# Altium footprint library IC.PcbLib: 220 footprints (part 14 of 14)
Each footprint in its own frame and in the unit in brackets; x right, y up, seen from the top. Pads: shape width x height; smd on the part's side, far side on the other; paste and mask are expansions set on the pad; w line width, h text height; cw(c..) or ccw(c..) is an arc to the next point about the centre after c.
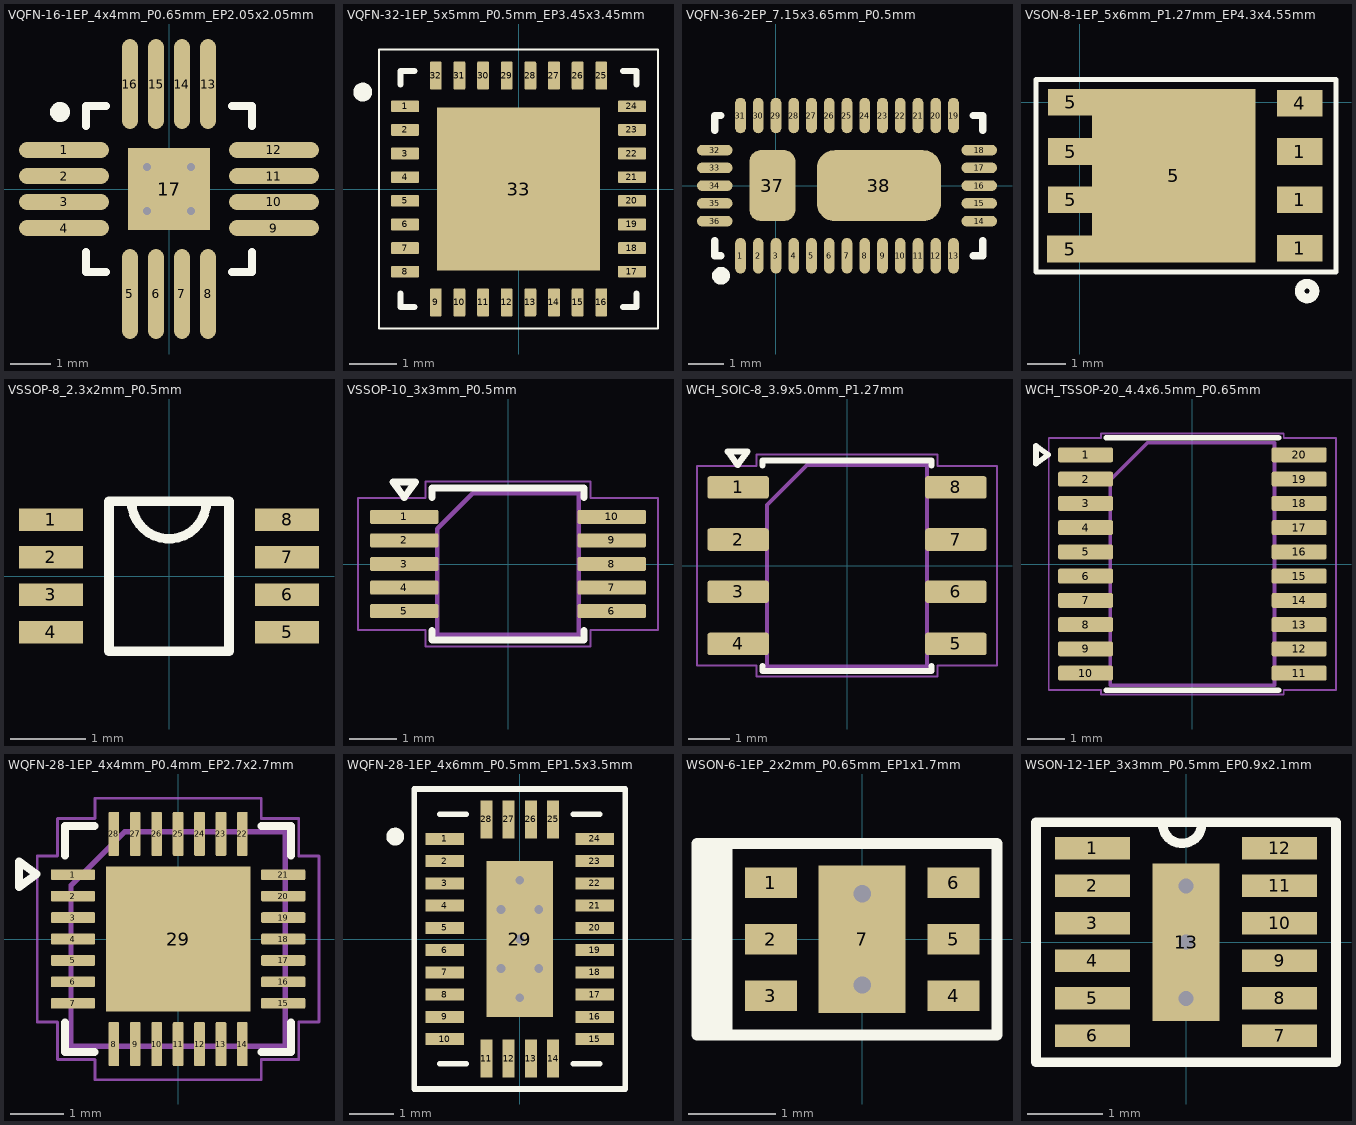
[diagram p13: the footprints below, top view; thin cyan lines are the x and y axes]

## VQFN-16-1EP_4x4mm_P0.65mm_EP2.05x2.05mm [mm] "VQFN-16 with exposed pad 2.05x2.05mm, body 4x4mm, pitch 0.65mm"
height 1
pads (17):
  oval 2.25x0.4 smd mask+0.076: 1(-2.625,0.975) 2(-2.625,0.325) 3(-2.625,-0.325) 4(-2.625,-0.975) 9(2.625,-0.975) 10(2.625,-0.325) 11(2.625,0.325) 12(2.625,0.975)
  oval 0.4x2.25 smd mask+0.076: 5(-0.975,-2.625) 6(-0.325,-2.625) 7(0.325,-2.625) 8(0.975,-2.625) 13(0.975,2.625) 14(0.325,2.625) 15(-0.325,2.625) 16(-0.975,2.625)
  rect 2.05x2.05 smd mask+0.076: 17(0,0)
via 0.55,-0.55 diameter 0.5 hole 0.2
via -0.55,-0.55 diameter 0.5 hole 0.2
via 0.55,0.55 diameter 0.5 hole 0.2
via -0.55,0.55 diameter 0.5 hole 0.2
Top Overlay:
  circle w0.25: c-2.725,1.925 r0.125
  lines w0.2: -2.075,-1.575 -2.075,-2.075 -1.575,-2.075 ; -2.075,1.575 -2.075,2.075 -1.575,2.075 ; 1.575,-2.075 2.075,-2.075 2.075,-1.575 ; 1.575,2.075 2.075,2.075 2.075,1.575
3D body "INA3221.step": height 1, standoff 0, extent -2.075,-2.075 2.075,2.075

## VQFN-32-1EP_5x5mm_P0.5mm_EP3.45x3.45mm [mm] "VQFN-32 with exposed pad 3.45x3.45mm, body 5x5mm, pitch 0.5mm"
pads (33):
  rrect25% 0.6x0.25 smd mask+0: 1(-2.4,1.75) 2(-2.4,1.25) 3(-2.4,0.75) 4(-2.4,0.25) 5(-2.4,-0.25) 6(-2.4,-0.75) 7(-2.4,-1.25) 8(-2.4,-1.75) 17(2.4,-1.75) 18(2.4,-1.25) 19(2.4,-0.75) 20(2.4,-0.25) 21(2.4,0.25) 22(2.4,0.75) 23(2.4,1.25) 24(2.4,1.75)
  rrect25% 0.25x0.6 smd mask+0: 9(-1.75,-2.4) 10(-1.25,-2.4) 11(-0.75,-2.4) 12(-0.25,-2.4) 13(0.25,-2.4) 14(0.75,-2.4) 15(1.25,-2.4) 16(1.75,-2.4) 25(1.75,2.4) 26(1.25,2.4) 27(0.75,2.4) 28(0.25,2.4) 29(-0.25,2.4) 30(-0.75,2.4) 31(-1.25,2.4) 32(-1.75,2.4)
  rect 3.45x3.45 smd paste-3 mask+0: 33(0,0)
Top Overlay:
  circle w0.2: c-3.295,2.05 r0.1
  lines w0.05: -2.95,-2.95 2.95,-2.95 2.95,2.95 -2.95,2.95 -2.95,-2.95
  lines w0.127: -2.5,-2.205 -2.5,-2.5 -2.205,-2.5 ; -2.5,2.205 -2.5,2.5 -2.205,2.5 ; 2.205,-2.5 2.5,-2.5 2.5,-2.205 ; 2.205,2.5 2.5,2.5 2.5,2.205
Top Paste:
  region: 1.59,-1.59 0.1,-1.59 0.1,-0.1 1.59,-0.1
  region: -0.1,-1.59 -1.59,-1.59 -1.59,-0.1 -0.1,-0.1
  region: 1.59,0.1 0.1,0.1 0.1,1.59 1.59,1.59
  region: -0.1,0.1 -1.59,0.1 -1.59,1.59 -0.1,1.59
Top Solder:
  drawing of 33 lines, arcs and shapes, not listed
3D body "User Library-VQFN-32.step": height 1.01, standoff 0, extent -2.56,-2.56 2.56,2.56

## VQFN-36-2EP_7.15x3.65mm_P0.5mm [mm] "VQFN-36 rectangular with dual exposed pads, body 7.15x3.65mm, pitch 0.5mm"
height 1
pads (38):
  oval 0.3x1 smd mask+0.076: 1(-1,-1.975) 2(-0.5,-1.975) 3(0,-1.975) 4(0.5,-1.975) 5(1,-1.975) 6(1.5,-1.975) 7(2,-1.975) 8(2.5,-1.975) 9(3,-1.975) 10(3.5,-1.975) 11(4,-1.975) 12(4.5,-1.975) 13(5,-1.975) 19(5,1.975) 20(4.5,1.975) 21(4,1.975) 22(3.5,1.975) 23(3,1.975) 24(2.5,1.975) 25(2,1.975) 26(1.5,1.975) 27(1,1.975) 28(0.5,1.975) 29(0,1.975) 30(-0.5,1.975) 31(-1,1.975)
  oval 1x0.3 smd mask+0.076: 14(5.725,-1) 15(5.725,-0.5) 16(5.725,0) 17(5.725,0.5) 18(5.725,1) 32(-1.725,1) 33(-1.725,0.5) 34(-1.725,0) 35(-1.725,-0.5) 36(-1.725,-1)
  rrect50% 1.3x2 smd: 37(-0.1,0)
  rrect50% 3.5x2 smd: 38(2.9,0)
Top Overlay:
  circle w0.25: c-1.55,-2.54 r0.125
  lines w0.2: -1.725,-1.55 -1.725,-1.975 -1.55,-1.975 ; -1.725,1.55 -1.725,1.975 -1.55,1.975 ; 5.55,-1.975 5.825,-1.975 5.825,-1.55 ; 5.55,1.975 5.825,1.975 5.825,1.55
3D body "VQFN36.step": height 1, standoff 0, extent -1.625,-1.875 5.625,1.875

## VSON-8-1EP_5x6mm_P1.27mm_EP4.3x4.55mm [mm] "VSONP-8 with exposed pad 4.29x4.55mm, pitch 1.27mm"
height 1.1
pads (9):
  rect 1.2x0.7 smd: 1(5.776,-3.83) 1(5.776,-2.56) 1(5.776,-1.29) 4(5.776,-0.02) 5(-0.249,-3.85) 5(-0.226,-2.56) 5(-0.226,-1.29) 5(-0.226,0)
  rect 4.295x4.55 smd: 5(2.475,-1.925)
Top Overlay:
  circle w0.254: c5.971,-4.953 r0.195
  lines w0.127: -1.143,-4.45 6.731,-4.45 6.731,0.6 -1.143,0.6 -1.143,-4.45
3D body "User Library-VSON-8.step": height 1.01, standoff 0.01, extent -0.226,-4.425 5.776,0.575

## VSSOP-8_2.3x2mm_P0.5mm [mm] "VSSOP-8 (US8), body 2.3x2.0mm, pitch 0.5mm"
height 0.9
pads (8):
  rect 0.85x0.3 smd mask+0.076: 1(-1.575,0.75) 2(-1.575,0.25) 3(-1.575,-0.25) 4(-1.575,-0.75) 5(1.575,-0.75) 6(1.575,-0.25) 7(1.575,0.25) 8(1.575,0.75)
Top Overlay:
  lines w0.127: -0.5,1 ccw(c0,1) 0.5,1 ; -0.8,-1 -0.8,1 0.8,1 0.8,-1 -0.8,-1
3D body "74AUP2G86DC,125.stp": height 1, standoff 0, extent -1.55,-1 1.55,1

## VSSOP-10_3x3mm_P0.5mm [mm] "VSSOP-10, 3 x 3 mm, 0.5 mm pitch — Vỏ IC mười chân [Vo IC muoi chan]"
height 0.95
pads (10):
  rrect25% 1.45x0.3 smd: 1(-2.2,1) 2(-2.2,0.5) 3(-2.2,0) 4(-2.2,-0.5) 5(-2.2,-1) 6(2.2,-1) 7(2.2,-0.5) 8(2.2,0) 9(2.2,0.5) 10(2.2,1)
Top Overlay:
  lines w0.15: -1.61,-1.41 -1.61,-1.61 1.61,-1.61 1.61,-1.41 ; -1.61,1.41 -1.61,1.61 1.61,1.61 1.61,1.41 ; -2.44,1.74 -2.2,1.41 -1.96,1.74 -2.44,1.74
Mechanical 2:
  lines w0.1: -1.5,-1.5 1.5,-1.5 1.5,1.5 -0.75,1.5 -1.5,0.75 -1.5,-1.5
Mechanical 4:
  lines w0.05: -3.18,-1.4 -3.18,1.4 -1.75,1.4 -1.75,1.75 1.75,1.75 1.75,1.4 3.18,1.4 3.18,-1.4 1.75,-1.4 1.75,-1.75 -1.75,-1.75 -1.75,-1.4 -3.18,-1.4
3D body "VSSOP-10_3x3mm_P0.5mm.step": height 0, standoff 0, extent -2.925,-1.15 2.925,1.15

## WCH_SOIC-8_3.9x5.0mm_P1.27mm [mm] "CH32V003J4M6, RISC-V MCU, 48 MHz, 16 KB flash — Vi điều khiển RISC-V 48 MHz, flash 16 KB [Vi dieu khien RISC-V 48 MHz, flash 16 KB]"
height 1.55
pads (8):
  rrect25% 1.5x0.55 smd: 1(-2.65,1.905) 2(-2.65,0.635) 3(-2.65,-0.635) 4(-2.65,-1.905) 5(2.65,-1.905) 6(2.65,-0.635) 7(2.65,0.635) 8(2.65,1.905)
Top Overlay:
  lines w0.15: -2.06,-2.44 -2.06,-2.56 2.06,-2.56 2.06,-2.44 ; -2.06,2.44 -2.06,2.56 2.06,2.56 2.06,2.44 ; -2.9,2.78 -2.66,2.45 -2.42,2.78 -2.9,2.78
Mechanical 2:
  lines w0.1: -1.95,-2.45 1.95,-2.45 1.95,2.45 -0.975,2.45 -1.95,1.475 -1.95,-2.45
Mechanical 4:
  lines w0.05: -3.65,-2.43 -3.65,2.43 -2.2,2.43 -2.2,2.7 2.2,2.7 2.2,2.43 3.65,2.43 3.65,-2.43 2.2,-2.43 2.2,-2.7 -2.2,-2.7 -2.2,-2.43 -3.65,-2.43
3D body "WCH_SOIC-8_3.9x5.0mm_P1.27mm.step": height 0, standoff 0, extent -3.4,-2.18 3.4,2.18

## WCH_TSSOP-20_4.4x6.5mm_P0.65mm [mm] "CH32V003F4P6, RISC-V MCU, 48 MHz, 16 KB flash — Vi điều khiển RISC-V 48 MHz, flash 16 KB [Vi dieu khien RISC-V 48 MHz, flash 16 KB]"
height 1.1
pads (20):
  rrect25% 1.475x0.4 smd: 1(-2.863,2.925) 2(-2.863,2.275) 3(-2.863,1.625) 4(-2.863,0.975) 5(-2.863,0.325) 6(-2.863,-0.325) 7(-2.863,-0.975) 8(-2.863,-1.625) 9(-2.863,-2.275) 10(-2.863,-2.925) 11(2.863,-2.925) 12(2.863,-2.275) 13(2.863,-1.625) 14(2.863,-0.975) 15(2.863,-0.325) 16(2.863,0.325) 17(2.863,0.975) 18(2.863,1.625) 19(2.863,2.275) 20(2.863,2.925)
Top Overlay:
  lines w0.15: -2.31,-3.385 2.31,-3.385 ; -2.31,3.385 2.31,3.385 ; -4.19,2.69 -3.86,2.93 -4.19,3.17 -4.19,2.69
Mechanical 2:
  lines w0.1: -2.2,-3.25 2.2,-3.25 2.2,3.25 -1.2,3.25 -2.2,2.25 -2.2,-3.25
Mechanical 4:
  lines w0.05: -3.85,-3.38 -3.85,3.38 -2.45,3.38 -2.45,3.5 2.45,3.5 2.45,3.38 3.85,3.38 3.85,-3.38 2.45,-3.38 2.45,-3.5 -2.45,-3.5 -2.45,-3.38 -3.85,-3.38
3D body "WCH_TSSOP-20_4.4x6.5mm_P0.65mm.step": height 0, standoff 0, extent -3.6,-3.125 3.6,3.125

## WQFN-28-1EP_4x4mm_P0.4mm_EP2.7x2.7mm [mm] "CH32X035G8U6, RISC-V MCU with USB PD PHY — Vi điều khiển RISC-V tích hợp PHY USB PD [Vi dieu khien RISC-V tich hop PHY USB PD]"
height 0.75
pads (29):
  rrect25% 0.825x0.2 smd: 1(-1.963,1.2) 2(-1.963,0.8) 3(-1.963,0.4) 4(-1.963,0) 5(-1.963,-0.4) 6(-1.963,-0.8) 7(-1.963,-1.2) 15(1.963,-1.2) 16(1.963,-0.8) 17(1.963,-0.4) 18(1.963,0) 19(1.963,0.4) 20(1.963,0.8) 21(1.963,1.2)
  rrect25% 0.2x0.825 smd: 8(-1.2,-1.963) 9(-0.8,-1.963) 10(-0.4,-1.963) 11(0,-1.963) 12(0.4,-1.963) 13(0.8,-1.963) 14(1.2,-1.963) 22(1.2,1.963) 23(0.8,1.963) 24(0.4,1.963) 25(0,1.963) 26(-0.4,1.963) 27(-0.8,1.963) 28(-1.2,1.963)
  rect 2.7x2.7 smd paste-2.7: 29(0,0)
Top Overlay:
  lines w0.15: -2.11,-1.56 -2.11,-2.11 -1.56,-2.11 ; -2.11,1.56 -2.11,2.11 -1.56,2.11 ; 1.56,-2.11 2.11,-2.11 2.11,-1.56 ; 1.56,2.11 2.11,2.11 2.11,1.56 ; -2.97,0.97 -2.64,1.21 -2.97,1.45 -2.97,0.97
Top Paste:
  region: -1.22,0.13 -0.13,0.13 -0.13,1.22 -1.22,1.22
  region: -1.22,-1.22 -0.13,-1.22 -0.13,-0.13 -1.22,-0.13
  region: 0.13,0.13 1.22,0.13 1.22,1.22 0.13,1.22
  region: 0.13,-1.22 1.22,-1.22 1.22,-0.13 0.13,-0.13
Mechanical 2:
  lines w0.1: -2,-2 2,-2 2,2 -1,2 -2,1 -2,-2
Mechanical 4:
  lines w0.05: -2.63,-1.55 -2.63,1.55 -2.25,1.55 -2.25,2.25 -1.55,2.25 -1.55,2.63 1.55,2.63 1.55,2.25 2.25,2.25 2.25,1.55 2.63,1.55 2.63,-1.55 2.25,-1.55 2.25,-2.25 1.55,-2.25 1.55,-2.63 -1.55,-2.63 -1.55,-2.25 -2.25,-2.25 -2.25,-1.55 -2.63,-1.55
3D body "WQFN-28-1EP_4x4mm_P0.4mm_EP2.7x2.7mm.step": height 0, standoff 0, extent -2.375,-2.375 2.375,2.375

## WQFN-28-1EP_4x6mm_P0.5mm_EP1.5x3.5mm [mm] "WQFN-28 with exposed pad 1.5x3.5mm, body 4x6mm, pitch 0.5mm"
height 0.8
pads (29):
  rect 0.86x0.27 smd: 1(-1.685,2.25) 2(-1.685,1.75) 3(-1.685,1.25) 4(-1.685,0.75) 5(-1.685,0.25) 6(-1.685,-0.25) 7(-1.685,-0.75) 8(-1.685,-1.25) 9(-1.685,-1.75) 10(-1.685,-2.25) 15(1.685,-2.25) 16(1.685,-1.75) 17(1.685,-1.25) 18(1.685,-0.75) 19(1.685,-0.25) 20(1.685,0.25) 21(1.685,0.75) 22(1.685,1.25) 23(1.685,1.75) 24(1.685,2.25)
  rect 0.27x0.86 smd: 11(-0.75,-2.685) 12(-0.25,-2.685) 13(0.25,-2.685) 14(0.75,-2.685) 25(0.75,2.685) 26(0.25,2.685) 27(-0.25,2.685) 28(-0.75,2.685)
  rect 1.5x3.5 smd: 29(0,0)
via 0,1.32 diameter 0.4 hole 0.2
via 0,-1.32 diameter 0.4 hole 0.2
via 0,0 diameter 0.4 hole 0.2
via -0.425,0.66 diameter 0.4 hole 0.2
via -0.425,-0.66 diameter 0.4 hole 0.2
via 0.425,-0.66 diameter 0.4 hole 0.2
via 0.425,0.66 diameter 0.4 hole 0.2
Top Overlay:
  circle w0.2: c-2.8,2.3 r0.1
  lines w0.125: -2.37,-3.37 2.37,-3.37 2.37,3.37 -2.37,3.37 -2.37,-3.37
  lines w0.127: -1.8,-2.8 -1.2,-2.8 ; -1.8,2.8 -1.2,2.8 ; 1.2,-2.8 1.8,-2.8 ; 1.2,2.8 1.8,2.8
Top Paste:
  region: 0.16,1.69 0.69,1.69 0.69,0.16 0.16,0.16
  region: 0.16,-0.16 0.69,-0.16 0.69,-1.69 0.16,-1.69
  region: -0.69,1.69 -0.16,1.69 -0.16,0.16 -0.69,0.16
  region: -0.69,-0.16 -0.16,-0.16 -0.16,-1.69 -0.69,-1.69
3D body "WQFN-28-1EP_4x6mm_P0.5mm_E.step": height 0.9, standoff 0, extent -2.029,-3 2.029,3

## WSON-6-1EP_2x2mm_P0.65mm_EP1x1.7mm [mm] "WSON-6 with exposed pad 1.0x1.7mm, body 2x2mm, pitch 0.65mm"
height 0.8
pads (7):
  rect 0.6x0.35 smd mask+0.076: 1(-1.05,0.65) 2(-1.05,0) 3(-1.05,-0.65) 4(1.05,-0.65) 5(1.05,0) 6(1.05,0.65)
  rect 1x1.7 smd mask+0.076: 7(0,0)
via 0,0.525 diameter 0.4 hole 0.2
via 0,-0.525 diameter 0.4 hole 0.2
Top Overlay:
  rectangle: -1.85,-1.118 -1.494,1.125
  lines w0.127: -1.1,1.1 1.55,1.1 1.55,-1.1 -1.9,-1.1 -1.9,1.1 -0.9,1.1
3D body "TVS3300DRVR.stp": height 0.8, standoff 0, extent -1.05,-1 1.05,1

## WSON-12-1EP_3x3mm_P0.5mm_EP0.9x2.1mm [mm] "WSON-12 with exposed pad 0.89x2.1mm, body 3x3mm, pitch 0.5mm"
height 0.8
pads (13):
  rect 1x0.3 smd mask+0.076: 1(-1.25,1.25) 2(-1.25,0.75) 3(-1.25,0.25) 4(-1.25,-0.25) 5(-1.25,-0.75) 6(-1.25,-1.25) 7(1.25,-1.25) 8(1.25,-0.75) 9(1.25,-0.25) 10(1.25,0.25) 11(1.25,0.75) 12(1.25,1.25)
  rect 0.889x2.1 smd mask+0.076: 13(0,0)
via 0,0.75 diameter 0.4 hole 0.2
via 0,-0.75 diameter 0.4 hole 0.2
via 0,0 diameter 0.4 hole 0.2
Top Overlay:
  lines w0.127: -0.307,1.535 ccw(c-0.051,1.575) 0.204,1.528 ; -2,-1.6 -2,1.6 2,1.6 2,-1.6 -2,-1.6
3D body "DRV8835DSSR.stp": height 0.8, standoff 0, extent -1.05,-1.5 1.05,1.5